# Altium footprint library Footprints.PcbLib: 158 footprints (part 9 of 10)
Each footprint in its own frame and in the unit in brackets; x right, y up, seen from the top. Pads: shape width x height; smd on the part's side, far side on the other; paste and mask are expansions set on the pad; w line width, h text height; cw(c..) or ccw(c..) is an arc to the next point about the centre after c.
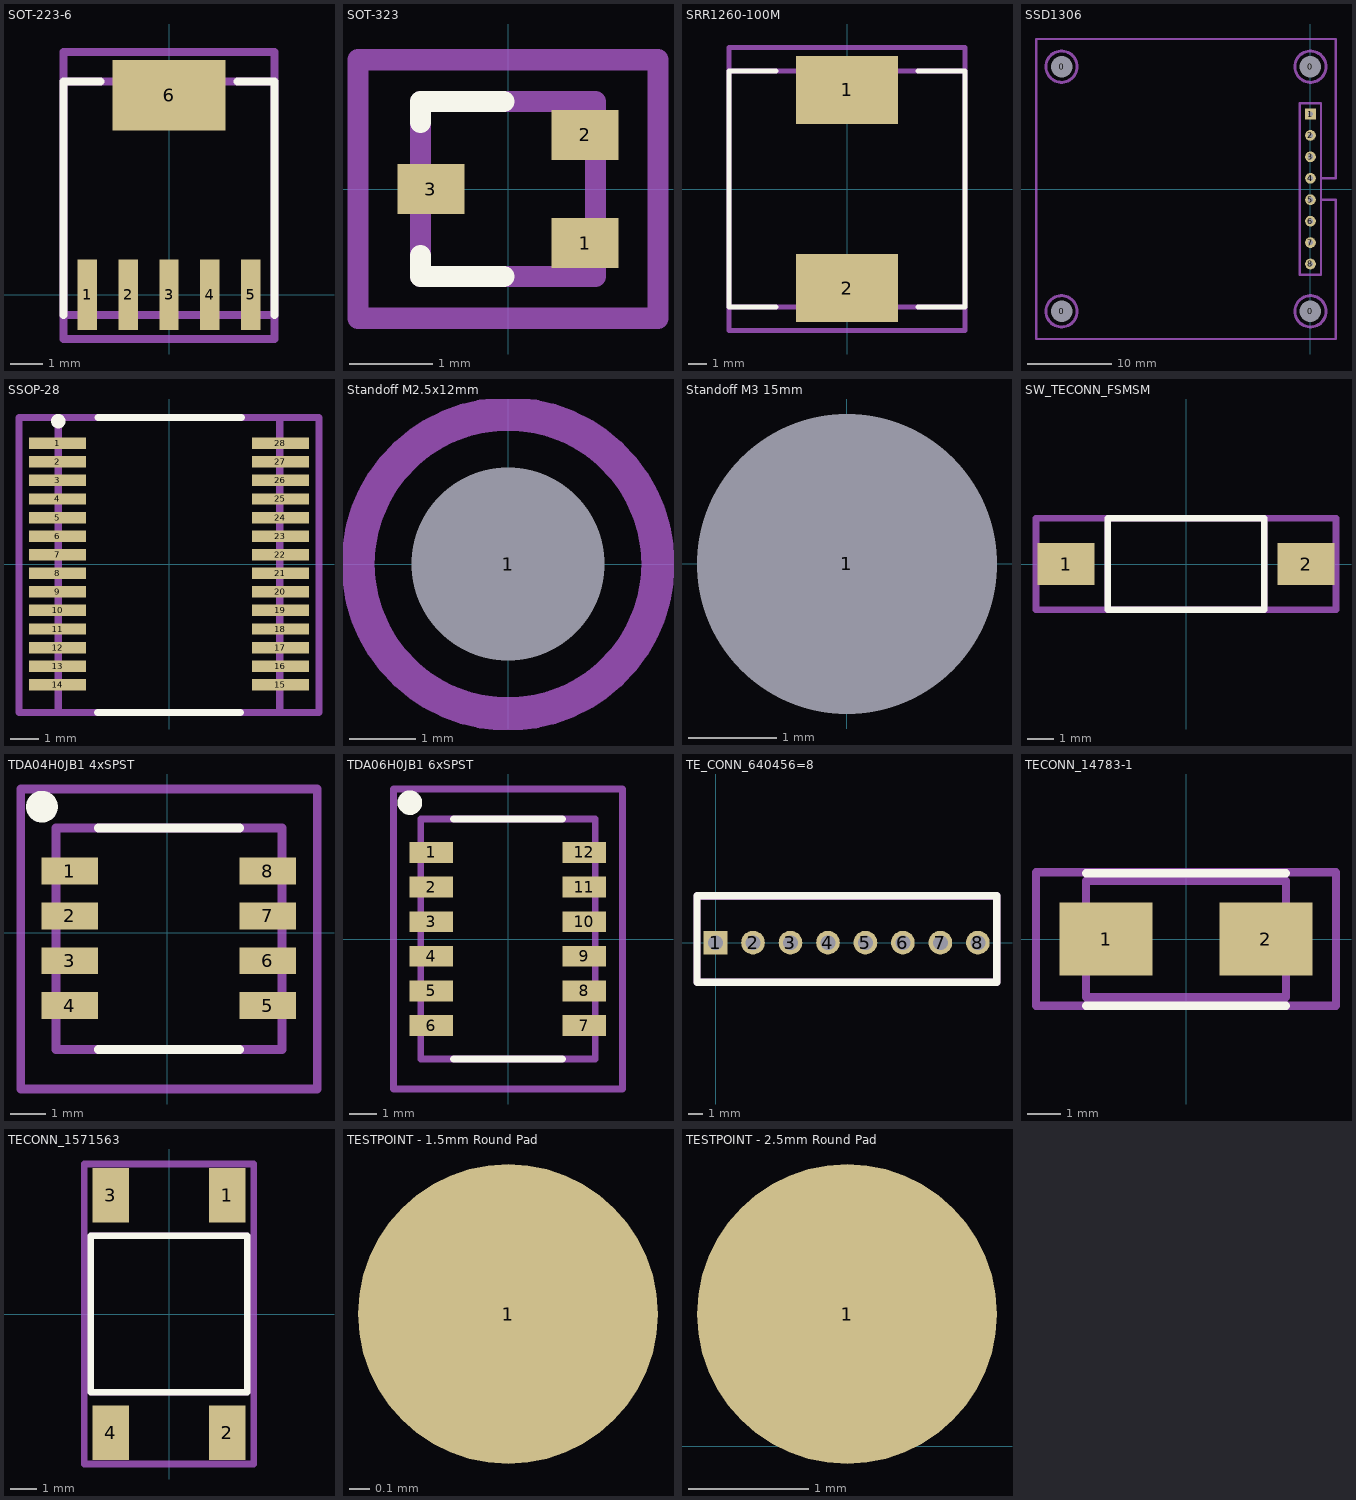
[diagram p8: the footprints below, top view; thin cyan lines are the x and y axes]

## SOT1023 [mm]
height 1.1

## SOT-223-6 [mm]
height 1.8
pads (6):
  rect 0.6x2.2 smd mask+0.102: 1(-2.54,0) 2(-1.27,0) 3(0,0) 4(1.27,0) 5(2.54,0)
  rect 3.5x2.2 smd mask+0.102: 6(0,6.2)
Top Overlay:
  lines w0.254: -3.275,-0.625 -3.275,6.625 -2.125,6.625 ; 2.125,6.625 3.275,6.625 3.275,-0.625
Mechanical 13:
  lines w0.254: -3.275,-0.63 3.275,-0.63 3.275,6.63 -3.275,6.63 -3.275,-0.63
Mechanical 15:
  lines w0.254: -3.275,-1.375 3.275,-1.375 3.275,7.55 -3.275,7.55 -3.275,-1.375
3D body: height 1.8, standoff 0, extent -3.275,-0.63 3.275,6.63

## SOT-323 [mm]
height 1.1
pads (3):
  rect 0.8x0.6 smd mask+0.102: 1(0.925,-0.65) 2(0.925,0.65) 3(-0.925,0)
Top Overlay:
  lines w0.254: -1.05,-0.8 -1.05,-1.05 -0.05,-1.05 ; -1.05,0.8 -1.05,1.05 -0.05,1.05
Mechanical 13:
  lines w0.254: -1.05,-1.05 -1.05,1.05 1.05,1.05 1.05,-1.05 -1.05,-1.05
Mechanical 15:
  lines w0.254: -1.8,-1.55 1.8,-1.55 1.8,1.55 -1.8,1.55 -1.8,-1.55
3D body: height 0.9, standoff 0, extent -1.05,-1.05 1.05,1.05

## SRR1260-100M [mm]
height 6
pads (2):
  rect 5.4x3.6 smd mask+0.102: 1(0,5.25) 2(0,-5.25)
Top Overlay:
  lines w0.254: -3.75,-6.25 -6.25,-6.25 -6.25,6.25 -3.75,6.25 ; 3.75,-6.25 6.25,-6.25 6.25,6.25 3.75,6.25
Mechanical 13:
  lines w0.254: -6.25,-6.25 -6.25,6.25 6.25,6.25 6.25,-6.25 -6.25,-6.25
Mechanical 15:
  lines w0.254: -6.25,-7.5 6.25,-7.5 6.25,7.5 -6.25,7.5 -6.25,-7.5
3D body: height 6.29, standoff 0, extent -6.25,-6.25 6.25,6.25

## SSD1306 [mm]
pads (12):
  round 1.27 hole 2.54: 0(-29.5,-14.5) 0(-29.5,14.5) 0(0,-14.5) 0(0,14.5)
  rect 1.27x1.27 hole 0.635: 1(0,8.89)
  round 1.27 hole 0.635: 2(0,6.35) 3(0,3.81) 4(0,1.27) 5(0,-1.27) 6(0,-3.81) 7(0,-6.35) 8(0,-8.89)
Mechanical 13:
  circle w0.254: c0,14.5 r1.8
  circle w0.254: c0,-14.5 r1.8
  circle w0.254: c-29.5,-14.5 r1.8
  circle w0.254: c-29.5,14.5 r1.8
  lines w0.254: -1.27,-10.16 1.27,-10.16 1.27,-1.27 3,-1.27 3,-10.16 3,-17.78 -32.5,-17.78 -32.5,17.78 3,17.78 3,10.16 3,1.27 1.27,1.27 1.27,10.16 ; -1.27,-10.16 -1.27,-10.16 ; -1.27,-10.16 -1.27,10.16 1.27,10.16 ; 1.27,10.16 1.27,10.16
Mechanical 15:
  circle w0.254: c0,-14.5 r1.905
  circle w0.254: c-29.5,-14.5 r1.905
  circle w0.254: c0,14.5 r1.905
  circle w0.254: c-29.5,14.5 r1.905
  lines w0.254: -1.27,-10.16 1.27,-10.16 1.27,10.16 -1.27,10.16 -1.27,-10.16
3D body: height 15, standoff 10, extent -32.499,-17.779 2.999,17.779
3D body: height 10, standoff 0, extent -1.799,-16.299 1.799,-12.7
3D body: height 10, standoff 0, extent -31.299,12.701 -27.7,16.3
3D body: height 10, standoff 0, extent -1.799,12.7 1.799,16.299
3D body: height 10, standoff 0, extent -31.299,-16.299 -27.7,-12.7
3D body: height 18.91, standoff -3.45, extent -1.27,-10.16 1.27,10.16

## SSOP-28 [mm]
height 2
pads (28):
  rect 2x0.4 smd mask+0.102: 1(-3.9,4.225) 2(-3.9,3.575) 3(-3.9,2.925) 4(-3.9,2.275) 5(-3.9,1.625) 6(-3.9,0.975) 7(-3.9,0.325) 8(-3.9,-0.325) 9(-3.9,-0.975) 10(-3.9,-1.625) 11(-3.9,-2.275) 12(-3.9,-2.925) 13(-3.9,-3.575) 14(-3.9,-4.225) 15(3.9,-4.225) 16(3.9,-3.575) 17(3.9,-2.925) 18(3.9,-2.275) 19(3.9,-1.625) 20(3.9,-0.975) 21(3.9,-0.325) 22(3.9,0.325) 23(3.9,0.975) 24(3.9,1.625) 25(3.9,2.275) 26(3.9,2.925) 27(3.9,3.575) 28(3.9,4.225)
Top Overlay:
  circle w0.254: c-3.875,5 r0.125
  lines w0.254: -2.5,-5.2 2.5,-5.2 ; -2.475,5.125 2.525,5.125
Mechanical 13:
  lines w0.254: -3.875,-5.2 -3.875,5.125 3.875,5.125 3.875,-5.2 -3.875,-5.2
Mechanical 15:
  lines w0.254: -5.25,-5.2 -5.25,5.125 5.25,5.125 5.25,-5.2 -5.25,-5.2
3D body: height 2.15, standoff 0, extent -3.878,-5.2 3.878,5.13

## Standoff M2.5x12mm [mm]
height 12
pads (1):
  round 1 hole 2.9: 1(0,0)
Mechanical 13:
  circle w0.5: c0,0 r2.25
Mechanical 15:
  circle w0.5: c0,0 r2.25
3D body: height 0, standoff -8, extent -1.5,-1.499 1.5,1.499
3D body: height 12, standoff 0, extent -2.25,-2.248 2.25,2.249

## Standoff M3 15mm [mm]
height 15
pads (1):
  round 1 hole 3.4: 1(0,0)
3D body: height 15, standoff 0, extent -2.75,-2.75 2.75,2.75
3D body: height 0, standoff -8, extent -1.5,-1.499 1.5,1.499

## SW_TECONN_FSMSM [mm] "Single SMD SPST Switch"
height 4.57
pads (2):
  rect 2.18x1.6 smd mask+0.102: 1(-4.6,0) 2(4.6,0)
Top Overlay:
  lines w0.254: -3,-1.75 3,-1.75 3,1.75 -3,1.75 -3,-1.75
Mechanical 13:
  lines w0.254: -3,-1.75 3,-1.75 3,1.75 -3,1.75 -3,-1.75
Mechanical 15:
  lines w0.254: -5.75,-1.75 5.75,-1.75 5.75,1.75 -5.75,1.75 -5.75,-1.75
3D body: height 3.5, standoff 0, extent -3,-1.75 3,1.75
3D body: height 4.57, standoff 0.5, extent -1.5,-0.75 1.5,0.75
3D body: height 1, standoff 0, extent -5.25,-0.5 -3,0.5
3D body: height 1, standoff 0, extent 3,-0.5 5.25,0.5

## TDA04H0JB1 4xSPST [mm] "1.27mm pitch Microswitch Array"
height 2.3
pads (8):
  rect 1.6x0.76 smd: 1(-2.76,1.75) 2(-2.76,0.48) 3(-2.76,-0.79) 4(-2.76,-2.06) 5(2.85,-2.06) 6(2.85,-0.79) 7(2.85,0.48) 8(2.85,1.75)
Top Overlay:
  circle w0.5: c-3.55,3.575 r0.2
  lines w0.254: -1.95,-3.3 2.05,-3.3 ; -1.95,2.975 2.05,2.975
Mechanical 13:
  lines w0.254: -3.15,-3.3 3.25,-3.3 3.25,2.975 -3.15,2.975 -3.15,-3.3
Mechanical 15:
  lines w0.254: -4.15,-4.425 4.25,-4.425 4.25,4.075 -4.15,4.075 -4.15,-4.425
3D body: height 2, standoff 0, extent -3.15,-3.3 3.25,2.975
3D body: height 2.2, standoff 2, extent -0.95,-2.325 1.05,-1.725
3D body: height 2.2, standoff 2, extent -0.95,-1.025 1.05,-0.425
3D body: height 2.2, standoff 2, extent -0.95,0.275 1.05,0.875
3D body: height 2.2, standoff 2, extent -0.95,1.575 1.05,2.175
3D body: height 0.8, standoff 0, extent -3.225,1.45 -3.025,2.05
3D body: height 0.8, standoff 0, extent -3.225,0.18 -3.025,0.78
3D body: height 0.8, standoff 0, extent -3.225,-1.09 -3.025,-0.49
3D body: height 0.8, standoff 0, extent -3.225,-2.36 -3.025,-1.76
3D body: height 0.8, standoff 0, extent 3.15,-2.36 3.35,-1.76
3D body: height 0.8, standoff 0, extent 3.15,-1.09 3.35,-0.49
3D body: height 0.8, standoff 0, extent 3.15,0.18 3.35,0.78
3D body: height 0.8, standoff 0, extent 3.15,1.45 3.35,2.05

## TDA06H0JB1 6xSPST [mm] "1.27mm pitch Microswitch Array"
height 2.3
pads (12):
  rect 1.6x0.76 smd: 1(-2.81,3.175) 2(-2.81,1.905) 3(-2.81,0.635) 4(-2.81,-0.635) 5(-2.81,-1.905) 6(-2.81,-3.175) 7(2.8,-3.175) 8(2.8,-1.905) 9(2.8,-0.635) 10(2.8,0.635) 11(2.8,1.905) 12(2.8,3.175)
Top Overlay:
  circle w0.5: c-3.6,5 r0.2
  lines w0.254: -2,-4.4 2,-4.4 ; -2,4.4 2,4.4
Mechanical 13:
  lines w0.254: -3.2,-4.4 -3.2,4.4 3.2,4.4 3.2,-4.4 -3.2,-4.4
Mechanical 15:
  lines w0.254: -4.2,-5.5 -4.2,5.5 4.2,5.5 4.2,-5.5 -4.2,-5.5
3D body: height 0.8, standoff 0, extent 3.1,2.875 3.3,3.475
3D body: height 0.8, standoff 0, extent 3.1,1.605 3.3,2.205
3D body: height 0.8, standoff 0, extent 3.1,0.335 3.3,0.935
3D body: height 0.8, standoff 0, extent 3.1,-0.935 3.3,-0.335
3D body: height 0.8, standoff 0, extent 3.1,-2.205 3.3,-1.605
3D body: height 0.8, standoff 0, extent 3.1,-3.475 3.3,-2.875
3D body: height 0.8, standoff 0, extent -3.275,-3.475 -3.075,-2.875
3D body: height 0.8, standoff 0, extent -3.275,-2.205 -3.075,-1.605
3D body: height 0.8, standoff 0, extent -3.275,-0.935 -3.075,-0.335
3D body: height 0.8, standoff 0, extent -3.275,0.335 -3.075,0.935
3D body: height 0.8, standoff 0, extent -3.275,1.605 -3.075,2.205
3D body: height 0.8, standoff 0, extent -3.275,2.875 -3.075,3.475
3D body: height 2.2, standoff 2, extent -1,-3.7 1,-3.1
3D body: height 2.2, standoff 2, extent -1,-2.3 1,-1.7
3D body: height 2.2, standoff 2, extent -1,3 1,3.6
3D body: height 2.2, standoff 2, extent -1,1.7 1,2.3
3D body: height 2.2, standoff 2, extent -1,0.4 1,1
3D body: height 2.2, standoff 2, extent -1,-0.9 1,-0.3
3D body: height 2, standoff 0, extent -3.2,-4.4 3.2,4.4

## TE_CONN_640456=8 [mm]
height 9
pads (8):
  rect 1.6x1.6 hole 1 mask+0.102: 1(0,0)
  round 1.6 hole 1 mask+0.102: 2(2.54,0) 3(5.08,0) 4(7.62,0) 5(10.16,0) 6(12.7,0) 7(15.24,0) 8(17.78,0)
Top Overlay:
  lines w0.508: -1.255,-2.671 19.065,-2.671 19.065,3.171 -1.255,3.171 -1.255,-2.671
Mechanical 13:
  lines w0.508: -1.255,-2.671 19.065,-2.671 19.065,3.171 -1.255,3.171 -1.255,-2.671
Mechanical 15:
  lines w0.508: -1.255,-2.67 -1.255,3.15 19.075,3.15 19.075,-2.675 -1.25,-2.675
3D body: height 11.49, standoff -2.1, extent -1.255,-2.671 19.065,3.171

## TECONN_14783-1 [mm]
height 5
pads (2):
  rect 2.8x2.2 smd: 1(-2.4,0) 2(2.4,0)
Top Overlay:
  lines w0.254: -3,-2 3,-2 ; -3,1.975 3,1.975
Mechanical 13:
  lines w0.254: -3,-1.75 -3,1.75 3,1.75 3,-1.75 -3,-1.75
Mechanical 15:
  lines w0.254: -4.5,-2 -4.5,2 4.5,2 4.5,-2 -4.5,-2
3D body: height 1, standoff 0, extent -3.125,-0.5 -2.875,0.5
3D body: height 1, standoff 0, extent 2.875,-0.5 3.125,0.5
3D body: height 4.5, standoff 3, extent -1.5,-0.75 1.5,0.75
3D body: height 3.5, standoff 0.1, extent -3,-1.75 3,1.75

## TECONN_1571563 [mm] "SPST_Momentary"
height 3.97
pads (4):
  rect 1.4x2.1 smd mask+0.102: 1(2.24,4.55) 2(2.24,-4.55) 3(-2.24,4.55) 4(-2.24,-4.55)
Top Overlay:
  lines w0.254: -3,-3 -3,3 3,3 3,-3 -3,-3
Mechanical 13:
  lines w0.254: -3,-3 3,-3 3,3 -3,3 -3,-3
Mechanical 15:
  lines w0.254: -3.25,-5.75 3.25,-5.75 3.25,5.75 -3.25,5.75 -3.25,-5.75
3D body: height 4.97, standoff 1, extent -1.736,-1.746 1.75,1.747
3D body: height 3.57, standoff 0, extent -3,-3 3,3
3D body: height 1, standoff 0, extent -2.75,3 -1.75,4.5
3D body: height 1, standoff 0, extent 1.75,3 2.75,4.5
3D body: height 1, standoff 0, extent -2.75,-4.5 -1.75,-3
3D body: height 1, standoff 0, extent 1.75,-4.5 2.75,-3

## TESTPOINT - 1.5mm Round Pad [mm]
pads (1):
  round 1.5 smd: 1(-2.3,1.1)

## TESTPOINT - 2.5mm Round Pad [mm]
pads (1):
  round 2.5 smd: 1(-2.3,1.1)